# Altium footprint library MOLEX 1.25 连接器.PcbLib: 18 footprints (part 2 of 2)
Each footprint in its own frame and in the unit in brackets; x right, y up, seen from the top. Pads: shape width x height; smd on the part's side, far side on the other; paste and mask are expansions set on the pad; w line width, h text height; cw(c..) or ccw(c..) is an arc to the next point about the centre after c.
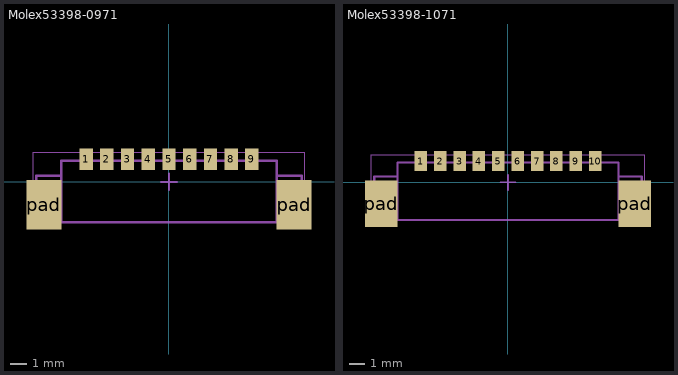
[diagram p1: the footprints below, top view; thin cyan lines are the x and y axes]

## Molex53398-0971 [mm] "Molex53398 连接器"
height 5.7
pads (11):
  rect 0.8x1.3 smd: 1(-5,1.375) 2(-3.75,1.375) 3(-2.5,1.375) 4(-1.25,1.375) 5(0,1.375) 6(1.25,1.375) 7(2.5,1.375) 8(3.75,1.375) 9(5,1.375)
  rect 2.1x3 smd: pad(-7.55,-1.375) pad(7.55,-1.375)
Mechanical 13:
  lines w0.05: -8.2,-2.421 -8.2,1.779 8.2,1.779 8.2,-2.421 -8.2,-2.421
Mechanical 15:
  lines w0.1: -0.508,0 0,0 ; 0,-0.508 0,0 ; 0,0.508 0,0 ; 0.508,0 0,0
  lines w0.15: -7.996,-0.221 -8.2,-0.425 -8.2,-2.221 -8,-2.421 ; -6.5,-2.421 -6.5,1.279 6.5,1.279 6.5,-2.421 ; -6.5,0.379 -8,0.379 -8,-2.421 ; 6.5,0.379 8,0.379 8,-2.421 ; 7.996,-0.221 8.2,-0.425 8.2,-2.221 8,-2.421 ; -8,-2.421 8,-2.421
3D body: height 4.71, standoff 0.01, extent -8.2,-2.421 8.2,1.779

## Molex53398-1071 [mm] "Molex53398 连接器"
height 5.7
pads (12):
  rect 0.8x1.3 smd: 1(-5.625,1.375) 2(-4.375,1.375) 3(-3.125,1.375) 4(-1.875,1.375) 5(-0.625,1.375) 6(0.625,1.375) 7(1.875,1.375) 8(3.125,1.375) 9(4.375,1.375) 10(5.625,1.375)
  rect 2.1x3 smd: pad(-8.175,-1.375) pad(8.175,-1.375)
Mechanical 13:
  lines w0.05: -8.825,-2.421 8.825,-2.421 8.825,1.779 -8.825,1.779 -8.825,-2.421
Mechanical 15:
  lines w0.1: -0.508,0 0,0 ; 0,-0.508 0,0 ; 0,0.508 0,0 ; 0.508,0 0,0
  lines w0.15: -8.621,-0.221 -8.825,-0.425 -8.825,-2.221 -8.625,-2.421 ; -7.125,-2.421 -7.125,1.279 7.125,1.279 7.125,-2.421 ; -7.125,0.379 -8.625,0.379 -8.625,-2.421 ; 7.125,0.379 8.625,0.379 8.625,-2.421 ; 8.621,-0.221 8.825,-0.425 8.825,-2.221 8.625,-2.421 ; -8.625,-2.421 8.625,-2.421
3D body: height 4.71, standoff 0.01, extent -8.825,-2.421 8.825,1.779